# Altium footprint library UltraZOhm_CarrierBoard.PcbLib: 123 footprints (part 5 of 8)
Each footprint in its own frame and in the unit in brackets; x right, y up, seen from the top. Pads: shape width x height; smd on the part's side, far side on the other; paste and mask are expansions set on the pad; w line width, h text height; cw(c..) or ccw(c..) is an arc to the next point about the centre after c.
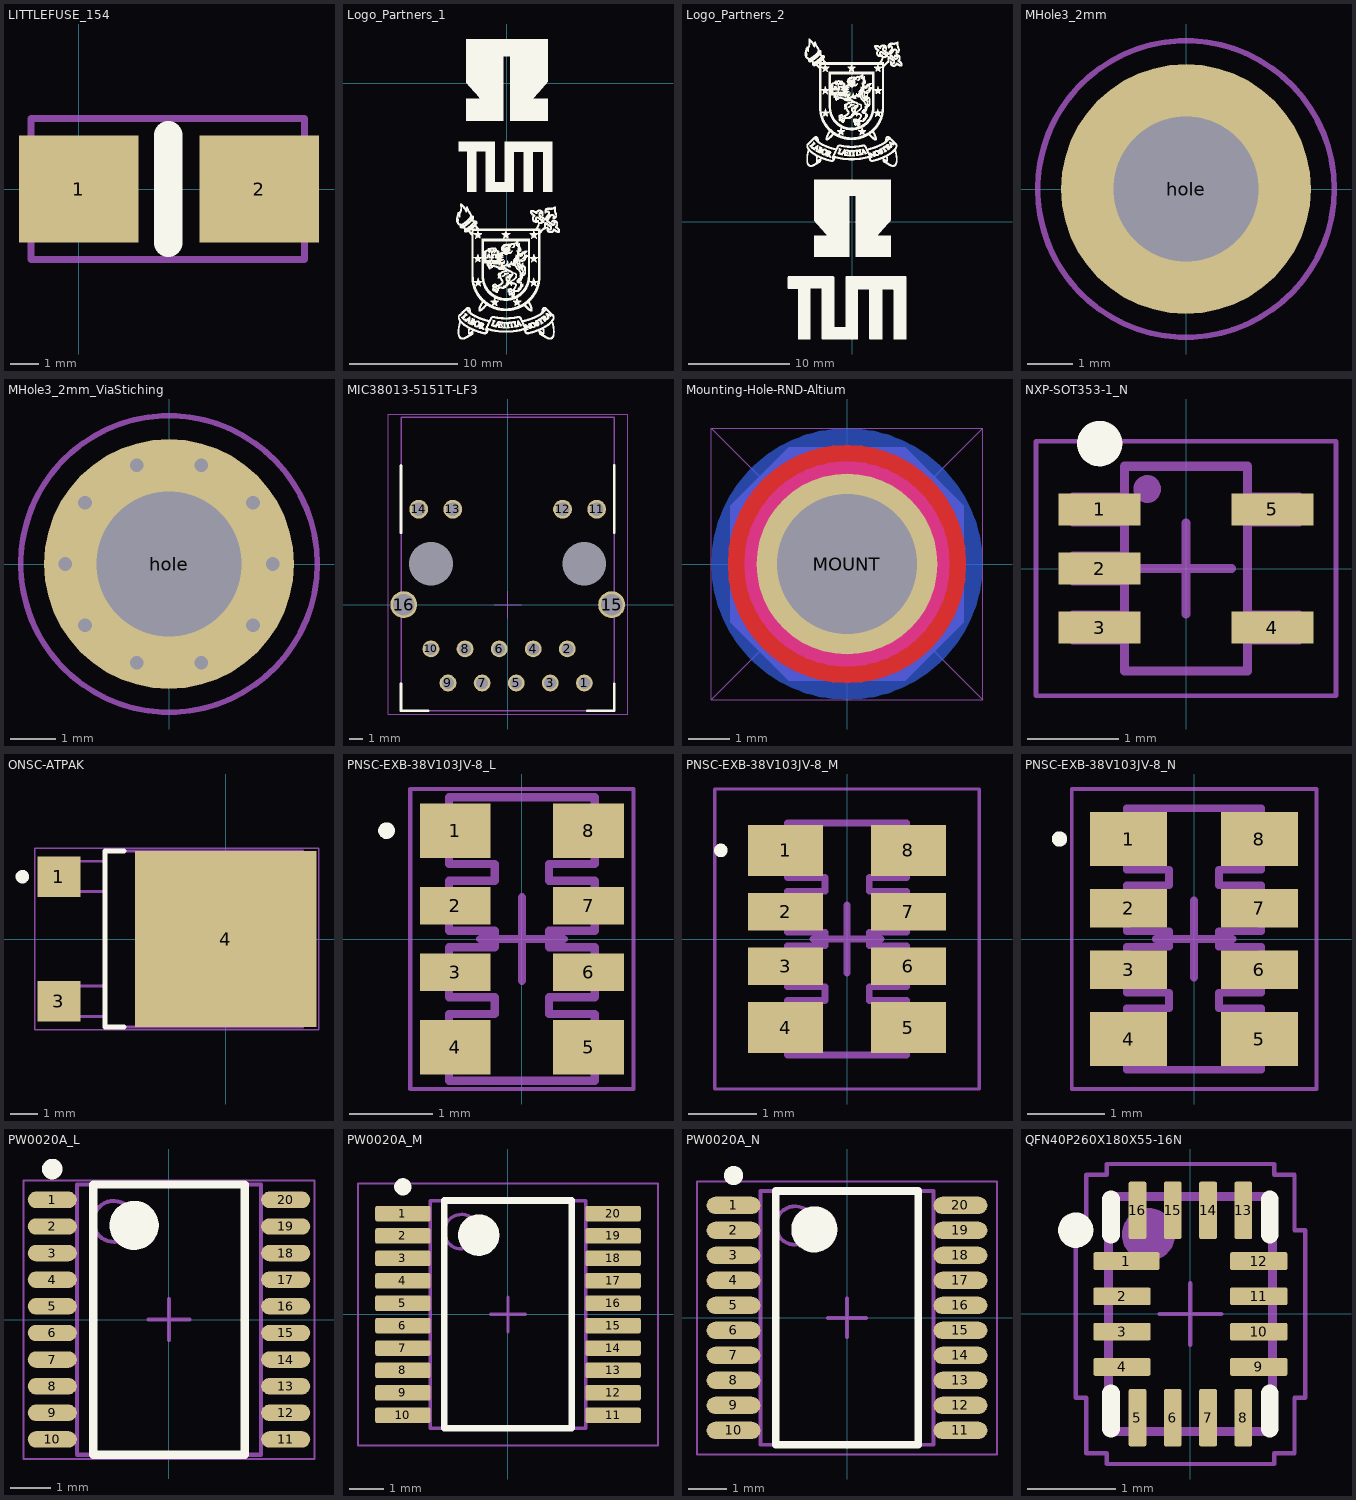
[diagram p4: the footprints below, top view; thin cyan lines are the x and y axes]

## LITTLEFUSE_154 [mm]
pads (2):
  rect 4.24x3.81 smd: 1(0,0) 2(6.4,0)
Top Overlay:
  lines w1: 3.175,-1.905 3.175,1.905
Top Assembly:
  lines w0.254: -1.7,-2.5 8,-2.5 8,2.5 -1.7,2.5 -1.7,-2.5
  text ".Designator" at 1.2,-0.9 h1.52
3D body "User Library-Littlefuse 0154 Holder and Fuse.STEP": height 3.71, standoff 0.01, extent -1.658,-2.487 8.042,2.513

## Logo_Partners_1 [mm] "THN, TUM and USACH Logo"
Top Overlay:
  drawing of 11309 lines, arcs and shapes, not listed

## Logo_Partners_2 [mm] "USACH, THN and TUM Logo"
Top Overlay:
  drawing of 13619 lines, arcs and shapes, not listed

## MHole3_2mm [mm]
pads (1):
  round 5.5 hole 3.2: hole(0,0)
Top Assembly:
  circle w0.1: c0,0 r3.25
  circle w0.1: c0,0 r1.6
  text ".Designator" at 3.5,1.4 h1.52
Mechanical 14:
  circle w0.1: c0,0 r1.6
  circle w0.1: c0,0 r3.25
Mechanical 15:
  circle w0.05: c0,0 r3.3
  lines w0.05: -1,0 1,0 ; 0,-1 0,1
Mechanical 16:
  circle w0.05: c0,0 r3.3
3D body "SW3dPS-DIN 967.STEP": height 2.33, standoff -4, extent -3.75,-3.75 3.75,3.75

## MHole3_2mm_ViaStiching [mm] "Mounting Hole with Via Stiching for better stability"
pads (1):
  round 5.5 hole 3.2: hole(0,0)
via 1.849,-1.344 diameter 0.6 hole 0.3
via 0.706,-2.174 diameter 0.6 hole 0.3
via -0.706,-2.174 diameter 0.6 hole 0.3
via -1.849,-1.344 diameter 0.6 hole 0.3
via -2.286,0 diameter 0.6 hole 0.3
via -1.849,1.344 diameter 0.6 hole 0.3
via -0.706,2.174 diameter 0.6 hole 0.3
via 0.706,2.174 diameter 0.6 hole 0.3
via 1.849,1.344 diameter 0.6 hole 0.3
via 2.286,0 diameter 0.6 hole 0.3
Top Assembly:
  circle w0.1: c0,0 r1.6
  circle w0.1: c0,0 r3.25
  text ".Designator" at 3.6,1.3 h1.52
Mechanical 14:
  circle w0.1: c0,0 r3.25
  circle w0.1: c0,0 r1.6
Mechanical 15:
  circle w0.05: c0,0 r3.3
  lines w0.05: -1,0 1,0 ; 0,-1 0,1
Mechanical 16:
  circle w0.05: c0,0 r3.3
3D body "SW3dPS-DIN 967.STEP": height 2.33, standoff -4, extent -3.75,-3.75 3.75,3.75

## MIC38013-5151T-LF3 [mm]
height 13.74
pads (18):
  round 1.25 hole 0.9: 1(5.715,-5.84) 2(4.445,-3.3) 3(3.175,-5.84) 4(1.905,-3.3) 5(0.635,-5.84) 6(-0.635,-3.3) 7(-1.905,-5.84) 8(-3.175,-3.3) 9(-4.445,-5.84) 10(-5.715,-3.3)
  round 1.4 hole 1: 11(6.63,7.11) 12(4.09,7.11) 13(-4.09,7.11) 14(-6.63,7.11)
  round 2 hole 1.6: 15(7.745,0) 16(-7.745,0)
  round 0 hole 3.25 unplated: H1(5.715,3.05) H2(-5.715,3.05)
Top Overlay:
  lines w0.2: -7.94,-5.9 -7.94,-7.9 -5.94,-7.9 ; -7.94,5.36 -7.94,10.36 ; 5.94,-7.9 7.94,-7.9 7.94,-5.9 ; 7.94,5.36 7.94,10.36
Top Assembly:
  lines w0.1: -7.94,-7.9 -7.94,13.94 7.94,13.94 7.94,-7.9 -7.94,-7.9
  text ".Designator" at -1.7,1.5 h1.52
Mechanical 15:
  lines w0.05: -1,0 1,0 ; 0,-1 0,1 ; -8.9,-8.15 8.95,-8.15 8.95,14.2 -8.9,14.2 -8.9,-8.15
3D body "7499111446.stp": height 15.81, standoff -3.17, extent -9.923,-7.96 9.923,13.88

## Mounting-Hole-RND-Altium [mm] "Mounting Hole, Altium, 4.4mm pad, 3.4mm plated hole"
height 3.5
pads (1):
  round 4.4 hole 3.4 mask+0.038: MOUNT(0,0)
Top Layer:
  circle w1: c0,0 r2.4
Bottom Layer:
  circle w1.2: c0,0 r2.702
Top Solder:
  circle w1.6: c0,0 r2.4
Bottom Solder:
  circle w2.6: c0,0 r2.3
Keep-Out Layer:
  circle w0.6: c0,0 r2.2
Mechanical 2:
  lines w0.025: -3.3,-3.3 0,0 ; -3.3,-3.3 3.3,-3.3 ; -3.3,-3.3 -3.3,3.3 ; -3.3,3.3 3.3,3.3 ; -3.3,3.3 0,0 ; 0,0 3.3,-3.3 ; 0,0 3.3,3.3 ; 3.3,-3.3 3.3,3.3
Mechanical 7:
  circle w1.2: c0,0 r2.2
  circle w0.1: c0,0.002 r2.7
  region: 0.8,-0.5 0.5,-0.8 1.066,-1.366 1.366,-1.066
  rectangle: 0.5,-1.6 1.6,-0.8
  region: 0.8,-0.5 0.8,-1.6 1.6,-1.6 1.6,-0.5
  region: -0.5,-0.8 -0.8,-0.5 -1.366,-1.066 -1.066,-1.366
  region: -1.6,-0.5 -1.6,-1.6 -0.8,-1.6 -0.8,-0.5
  region: -0.5,-0.8 -1.6,-0.8 -1.6,-1.6 -0.5,-1.6
  region: -0.8,0.5 -0.5,0.8 -1.066,1.366 -1.366,1.066
  region: -0.5,1.6 -1.6,1.6 -1.6,0.8 -0.5,0.8
  region: -0.8,0.5 -0.8,1.6 -1.6,1.6 -1.6,0.5
  region: 0.5,0.8 0.8,0.5 1.366,1.066 1.066,1.366
  region: 1.6,0.5 1.6,1.6 0.8,1.6 0.8,0.5
  rectangle: 0.5,0.8 1.6,1.6
Mechanical 8:
  circle w0.6: c0,0 r2
  rectangle: -2.8,-1.4 -1.7,1.4
  region: 1.4,1.7 1.4,2.8 -1.4,2.8 -1.4,1.7
  region: -1.4,-1.7 -1.4,-2.8 1.4,-2.8 1.4,-1.7
  region: 0.551,-1.951 1.4,-2.8 2.8,-1.4 1.951,-0.551
  region: 1.951,0.551 2.8,1.4 1.4,2.8 0.551,1.951
  region: -0.551,1.951 -1.4,2.8 -2.8,1.4 -1.951,0.551
  region: -1.951,-0.551 -2.8,-1.4 -1.4,-2.8 -0.551,-1.951
  rectangle: 1.7,-1.4 2.8,1.4
  lines w0.1: -2.8,-1.4 -2.8,1.4 -1.4,2.8 1.4,2.8 2.8,1.4 2.8,-1.4 1.4,-2.8 -1.4,-2.8 -2.8,-1.4

## NXP-SOT353-1_N [mm] "TSSOP, 5-Leads, Body 2.25x1.35mm, Pitch 0.65mm, IPC Medium Density"
height 1.1
pads (5):
  rect 0.9x0.35 smd: 1(-0.95,0.65) 2(-0.95,0) 3(-0.95,-0.65) 4(0.95,-0.65) 5(0.95,0.65)
Top Overlay:
  circle w0.25: c-0.95,1.375 r0.125
Top Assembly:
  circle w0.152: c-0.426,0.875 r0.076
  lines w0.05: -0.675,-0.813 -1.25,-0.813 -1.25,-0.488 -0.675,-0.488 ; -0.675,-0.163 -1.25,-0.163 -1.25,0.162 -0.675,0.162 ; -0.675,0.487 -1.25,0.487 -1.25,0.813 -0.675,0.813 ; 0.675,-0.813 1.25,-0.813 1.25,-0.487 0.675,-0.487 ; 0.675,0.488 1.25,0.488 1.25,0.813 0.675,0.813
  lines w0.1: -0.675,-1.125 0.675,-1.125 0.675,1.125 -0.675,1.125 -0.675,-1.125
  text ".Designator" at 0.4,-0.9 h0.76
Mechanical 15:
  lines w0.05: -1.65,-1.4 1.65,-1.4 1.65,1.4 -1.65,1.4 -1.65,-1.4
  lines w0.1: -0.5,0 0.5,0 ; 0,-0.5 0,0.5
3D body: height 1.1, standoff 0, extent -0.675,-1.125 0.675,1.125

## ONSC-ATPAK [mm] "DPAK, 3-Leads, Body 7.3x6.5mm, Pitch 2.3mm"
height 1.77
pads (3):
  rect 1.6x1.5 smd: 1(-6.15,2.3) 3(-6.15,-2.3)
  rect 6.7x6.5 smd: 4(0,0)
Top Overlay:
  circle w0.25: c-7.5,2.3 r0.125
  lines w0.2: -3.75,-3.25 -4.45,-3.25 -4.45,3.25 -3.75,3.25
Top Assembly:
  lines w0.1: -4.5,-2.863 -6.45,-2.863 -6.45,-1.737 -4.475,-1.737 ; -4.475,1.75 -6.425,1.75 -6.425,2.875 -4.45,2.875 ; -4.45,-3.25 2.85,-3.25 2.85,3.25 -4.45,3.25 -4.45,-3.25
  text ".Designator" at -2.4,-0.7 h1.52
Mechanical 15:
  lines w0.05: -7.05,-3.35 -7.05,3.35 ; -7.05,-3.35 3.45,-3.35 ; -7.05,-3.35 -7.05,3.35 ; -7.05,-3.35 3.45,-3.35 ; -7.05,3.35 3.45,3.35 ; -7.05,3.35 3.45,3.35 ; 3.45,-3.35 3.45,3.35 ; 3.45,-3.35 3.45,3.35
  lines w0.1: -0.5,0 0.5,0 ; 0,-0.5 0,0.5
3D body: height 1.77, standoff 0.02, extent -4.45,-3.25 2.85,3.25

## PNSC-EXB-38V103JV-8_L [mm] "Chip Array, ConvexS, 8-Leads, Pitch 0.80mm, Body 3.40x1.75mm, IPC High Density"
height 0.6
pads (8):
  rect 0.85x0.65 smd: 1(-0.8,1.3) 4(-0.8,-1.3) 5(0.8,-1.3) 8(0.8,1.3)
  rect 0.85x0.45 smd: 2(-0.8,0.4) 3(-0.8,-0.4) 6(0.8,-0.4) 7(0.8,0.4)
Top Overlay:
  circle w0.1: c-1.625,1.3 r0.05
Top Assembly:
  lines w0.1: -0.875,-1.7 -0.875,-0.9 -0.325,-0.9 -0.325,-0.7 -0.875,-0.7 -0.875,-0.1 -0.325,-0.1 -0.325,0.1 -0.875,0.1 -0.875,0.7 -0.325,0.7 -0.325,0.9 -0.875,0.9 -0.875,1.7 0.875,1.7 0.875,0.9 0.325,0.9 0.325,0.7 0.875,0.7 0.875,0.1 0.325,0.1 0.325,-0.1 0.875,-0.1 0.875,-0.7 0.325,-0.7 0.325,-0.9 0.875,-0.9 0.875,-1.7 -0.875,-1.7
  text ".Designator" at -0.7,2 h0.76
Mechanical 15:
  lines w0.05: -1.34,-1.8 -1.34,1.8 1.34,1.8 1.34,-1.8 -1.34,-1.8
  lines w0.1: -0.5,0 0.5,0 ; 0,-0.5 0,0.5
3D body: height 0.6, standoff 0, extent -0.875,-1.7 0.875,1.7

## PNSC-EXB-38V103JV-8_M [mm] "Chip Array, ConvexS, 8-Leads, Pitch 0.80mm, Body 3.40x1.75mm, IPC Low Density"
height 0.6
pads (8):
  rect 1.1x0.75 smd: 1(-0.9,1.3) 4(-0.9,-1.3) 5(0.9,-1.3) 8(0.9,1.3)
  rect 1.1x0.55 smd: 2(-0.9,0.4) 3(-0.9,-0.4) 6(0.9,-0.4) 7(0.9,0.4)
Top Overlay:
  circle w0.1: c-1.85,1.3 r0.05
Top Assembly:
  lines w0.1: -0.875,-1.7 0.875,-1.7 0.875,-0.9 0.325,-0.9 0.325,-0.7 0.875,-0.7 0.875,-0.1 0.325,-0.1 0.325,0.1 0.875,0.1 0.875,0.7 0.325,0.7 0.325,0.9 0.875,0.9 0.875,1.7 -0.875,1.7 -0.875,0.9 -0.325,0.9 -0.325,0.7 -0.875,0.7 -0.875,0.1 -0.325,0.1 -0.325,-0.1 -0.875,-0.1 -0.875,-0.7 -0.325,-0.7 -0.325,-0.9 -0.875,-0.9 -0.875,-1.7
  text ".Designator" at -0.8,2 h0.76
Mechanical 15:
  lines w0.05: -1.94,-2.2 -1.94,2.2 1.94,2.2 1.94,-2.2 -1.94,-2.2
  lines w0.1: -0.5,0 0.5,0 ; 0,-0.5 0,0.5
3D body: height 0.6, standoff 0, extent -0.875,-1.7 0.875,1.7

## PNSC-EXB-38V103JV-8_N [mm] "Chip Array, ConvexS, 8-Leads, Pitch 0.80mm, Body 3.40x1.75mm, IPC Medium Density"
height 0.6
pads (8):
  rect 1x0.7 smd: 1(-0.85,1.3) 4(-0.85,-1.3) 5(0.85,-1.3) 8(0.85,1.3)
  rect 1x0.5 smd: 2(-0.85,0.4) 3(-0.85,-0.4) 6(0.85,-0.4) 7(0.85,0.4)
Top Overlay:
  circle w0.1: c-1.75,1.3 r0.05
Top Assembly:
  lines w0.1: -0.875,-1.7 -0.875,-0.9 -0.325,-0.9 -0.325,-0.7 -0.875,-0.7 -0.875,-0.1 -0.325,-0.1 -0.325,0.1 -0.875,0.1 -0.875,0.7 -0.325,0.7 -0.325,0.9 -0.875,0.9 -0.875,1.7 0.875,1.7 0.875,0.9 0.325,0.9 0.325,0.7 0.875,0.7 0.875,0.1 0.325,0.1 0.325,-0.1 0.875,-0.1 0.875,-0.7 0.325,-0.7 0.325,-0.9 0.875,-0.9 0.875,-1.7 -0.875,-1.7
  text ".Designator" at -0.8,2 h0.76
Mechanical 15:
  lines w0.05: -1.59,-1.95 1.59,-1.95 1.59,1.95 -1.59,1.95 -1.59,-1.95
  lines w0.1: -0.5,0 0.5,0 ; 0,-0.5 0,0.5
3D body: height 0.6, standoff 0, extent -0.875,-1.7 0.875,1.7

## PW0020A_L [mm] "SOP, 20-Leads, Body 6.6x4.5mm, Pitch 0.65mm, IPC High Density"
height 1.2
pads (20):
  oval 1.2x0.4 smd: 1(-2.85,2.925) 2(-2.85,2.275) 3(-2.85,1.625) 4(-2.85,0.975) 5(-2.85,0.325) 6(-2.85,-0.325) 7(-2.85,-0.975) 8(-2.85,-1.625) 9(-2.85,-2.275) 10(-2.85,-2.925) 11(2.85,-2.925) 12(2.85,-2.275) 13(2.85,-1.625) 14(2.85,-0.975) 15(2.85,-0.325) 16(2.85,0.325) 17(2.85,0.975) 18(2.85,1.625) 19(2.85,2.275) 20(2.85,2.925)
Top Overlay:
  circle w0.6: c-0.85,2.3 r0.3
  circle w0.25: c-2.85,3.675 r0.125
  lines w0.2: -1.85,-3.3 1.85,-3.3 1.85,3.3 -1.85,3.3 -1.85,-3.3
Top Assembly:
  circle w0.1: c-1.35,2.4 r0.5
  lines w0.1: -2.25,-3.3 2.25,-3.3 2.25,3.3 -2.25,3.3 -2.25,-3.3
  text ".Designator" at -1.7,-0.9 h1.52
Mechanical 15:
  lines w0.05: -3.55,-3.4 3.55,-3.4 3.55,3.4 -3.55,3.4 -3.55,-3.4
  lines w0.1: -0.5,0 0.5,0 ; 0,-0.5 0,0.5
3D body "PW0020AakaMTC20.stp": height 1, standoff 0, extent -3.21,-3.25 3.21,3.25

## PW0020A_M [mm] "SOP, 20-Leads, Body 6.6x4.5mm, Pitch 0.65mm, IPC Low Density"
height 1.2
pads (20):
  rrect22% 1.6x0.45 smd: 1(-3.05,2.925) 2(-3.05,2.275) 3(-3.05,1.625) 4(-3.05,0.975) 5(-3.05,0.325) 6(-3.05,-0.325) 7(-3.05,-0.975) 8(-3.05,-1.625) 9(-3.05,-2.275) 10(-3.05,-2.925) 11(3.05,-2.925) 12(3.05,-2.275) 13(3.05,-1.625) 14(3.05,-0.975) 15(3.05,-0.325) 16(3.05,0.325) 17(3.05,0.975) 18(3.05,1.625) 19(3.05,2.275) 20(3.05,2.925)
Top Overlay:
  circle w0.6: c-0.85,2.3 r0.3
  circle w0.25: c-3.05,3.7 r0.125
  lines w0.2: -1.85,-3.3 1.85,-3.3 1.85,3.3 -1.85,3.3 -1.85,-3.3
Top Assembly:
  circle w0.1: c-1.35,2.4 r0.5
  lines w0.1: -2.25,-3.3 2.25,-3.3 2.25,3.3 -2.25,3.3 -2.25,-3.3
  text ".Designator" at -1.7,-0.7 h1.52
Mechanical 15:
  lines w0.05: -4.35,-3.8 4.35,-3.8 4.35,3.8 -4.35,3.8 -4.35,-3.8
  lines w0.1: -0.5,0 0.5,0 ; 0,-0.5 0,0.5
3D body "PW0020AakaMTC20.stp": height 1, standoff 0, extent -3.21,-3.25 3.21,3.25

## PW0020A_N [mm] "SOP, 20-Leads, Body 6.6x4.5mm, Pitch 0.65mm, IPC Medium Density"
height 1.2
pads (20):
  oval 1.4x0.45 smd: 1(-2.95,2.925) 2(-2.95,2.275) 3(-2.95,1.625) 4(-2.95,0.975) 5(-2.95,0.325) 6(-2.95,-0.325) 7(-2.95,-0.975) 8(-2.95,-1.625) 9(-2.95,-2.275) 10(-2.95,-2.925) 11(2.95,-2.925) 12(2.95,-2.275) 13(2.95,-1.625) 14(2.95,-0.975) 15(2.95,-0.325) 16(2.95,0.325) 17(2.95,0.975) 18(2.95,1.625) 19(2.95,2.275) 20(2.95,2.925)
Top Overlay:
  circle w0.6: c-0.85,2.3 r0.3
  circle w0.25: c-2.95,3.7 r0.125
  lines w0.2: -1.85,-3.3 1.85,-3.3 1.85,3.3 -1.85,3.3 -1.85,-3.3
Top Assembly:
  circle w0.1: c-1.35,2.4 r0.5
  lines w0.1: -2.25,-3.3 2.25,-3.3 2.25,3.3 -2.25,3.3 -2.25,-3.3
  text ".Designator" at -1.3,-0.7 h1.52
Mechanical 15:
  lines w0.05: -3.9,-3.55 3.9,-3.55 3.9,3.55 -3.9,3.55 -3.9,-3.55
  lines w0.1: -0.5,0 0.5,0 ; 0,-0.5 0,0.5
3D body "PW0020AakaMTC20.stp": height 1, standoff 0, extent -3.21,-3.25 3.21,3.25

## QFN40P260X180X55-16N [mm]
height 0.55
pads (16):
  rrect20% 0.75x0.2 smd: 1(-0.725,0.6)
  rrect20% 0.65x0.2 smd: 2(-0.775,0.2) 3(-0.775,-0.2) 4(-0.775,-0.6) 9(0.775,-0.6) 10(0.775,-0.2) 11(0.775,0.2) 12(0.775,0.6)
  rrect20% 0.2x0.65 smd: 5(-0.6,-1.175) 6(-0.2,-1.175) 7(0.2,-1.175) 8(0.6,-1.175) 13(0.6,1.175) 14(0.2,1.175) 15(-0.2,1.175) 16(-0.6,1.175)
Top Overlay:
  circle w0.2: c-1.3,0.95 r0.1
  lines w0.2: -0.9,-1.3 -0.9,-0.9 ; -0.9,0.9 -0.9,1.3 ; 0.9,-1.3 0.9,-0.9 ; 0.9,0.9 0.9,1.3
Top Assembly:
  circle w0.3: c-0.475,0.9 r0.15
  lines w0.1: -0.93,-1.33 0.93,-1.33 0.93,1.33 -0.93,1.33 -0.93,-1.33
  text ".Designator" at -0.025,1.05 h0.76
Mechanical 12:
  lines w0.001: -0.9,-1.3 0.9,-1.3 0.9,1.3 -0.9,1.3 -0.9,-1.3
Mechanical 15:
  lines w0.05: -0.35,0 0.35,0 ; 0,-0.35 0,0.35 ; -1.3,-0.95 -1.18,-0.95 -1.18,-1.58 -0.95,-1.58 -0.95,-1.7 0.95,-1.7 0.95,-1.58 1.18,-1.58 1.18,-0.95 1.3,-0.95 1.3,0.95 1.18,0.95 1.18,1.58 0.95,1.58 0.95,1.7 -0.95,1.7 -0.95,1.58 -1.18,1.58 -1.18,0.95 -1.3,0.95 -1.3,-0.95
3D body: height 0.55, standoff 0.03, extent -0.93,-1.33 0.93,1.33
3D body: height 0.56, standoff 0, extent -0.8,0.6 -0.2,1.2